# Altium footprint library sun_library.PcbLib: 412 footprints (part 13 of 26) (continued)
## LOGO_SUKHOVEY [mm] (continued)

## LogoMAR [mm]
Top:
  lines w0.15: -4.29,2.2 4.4,2.2 ; -4.289,2.4 4.4,2.4 ; -4.28,2.1 4.4,2.1 ; -4.278,2.5 4.4,2.5 ; -4.27,2 4.4,2 ; -4.267,2.6 4.4,2.6 ; -4.26,1.9 4.4,1.9 ; -4.255,2.7 -0.099,2.7 ; -4.25,1.8 2.1,1.8 ; -4.244,2.8 -0.199,2.8 -0.2,0 ; -4.24,1.7 -2.19,1.7 ; -4.233,2.9 -0.299,2.9 ; -4.23,1.6 -2.19,1.6 ; -4.222,3 -0.399,3 ; -4.22,1.5 -2.191,1.5 ; -4.211,3.1 -0.499,3.1 ; -4.21,1.4 -2.191,1.4 ; -4.2,1.302 -4.2,3.199 ; -4.183,3.3 -0.699,3.3 ; -4.175,1.2 -2.191,1.2 ; -4.167,3.4 -0.799,3.4 ; -4.15,1.1 -2.192,1.1 ; -4.15,3.5 -0.899,3.5 ; -4.133,3.6 -0.999,3.6 -1,0.701 ; -4.125,1 -2.192,1 ; -4.117,3.7 -1.099,3.7 ; -4.075,0.8 -2.192,0.8 ; -4.05,0.7 -2.192,0.7 ; -4.025,0.6 -2.193,0.6 ; -4,0.501 -4,3.891 ; -4,0.5 -2.193,0.5 ; -3.99,3.9 -1.299,3.9 ; -3.975,0.4 -2.193,0.4 ; -3.95,0.3 -2.193,0.3 ; -3.925,0.2 -2.194,0.2 ; -3.9,3.981 -3.9,0.101 ; -3.86,0 -2.194,0 ; -3.82,-0.1 -2.194,-0.1 ; -3.8,-0.149 -3.8,3.991 ; -3.78,-0.2 -2.194,-0.2 ; -3.74,-0.3 -2.195,-0.3 ; -3.7,-0.4 -2.195,-0.4 ; -3.7,-0.399 -3.7,3.991 ; -3.66,-0.5 -2.195,-0.5 ; -3.62,-0.6 -2.195,-0.6 ; -3.6,-0.649 -3.6,3.991 ; -3.58,-0.7 -2.196,-0.7 ; -3.54,-0.8 -2.196,-0.8 ; -3.5,-0.9 -2.196,-0.9 ; -3.5,3.991 -3.5,-0.899 ; -3.437,-1 -2.196,-1 ; -3.4,-1.059 -3.4,3.991 ; -3.375,-1.1 -2.196,-1.1 ; -3.312,-1.2 -2.197,-1.2 ; -3.3,-1.219 -3.3,3.991 ; -3.25,-1.3 -2.197,-1.3 ; -3.2,-1.379 -3.2,3.991 ; -3.187,-1.4 -2.197,-1.4 ; -3.125,-1.5 -2.197,-1.5 ; -3.1,-1.539 -3.1,3.991 ; -3.062,-1.6 -2.198,-1.6 ; -3,-1.7 -2.198,-1.7 ; -3,3.991 -3,-1.699 ; -2.925,-1.8 -2.198,-1.8 ; -2.9,-1.833 -2.9,3.991 ; -2.85,-1.9 -2.198,-1.9 ; -2.8,-1.966 -2.8,3.991 ; -2.775,-2 -2.199,-2 ; -2.699,-2.1 -2.199,-2.1 ; -2.7,3.991 -2.7,-2.099 ; -2.6,3.991 -2.6,-2.199 -2.199,-2.2 ; -2.5,3.991 -2.5,-2.299 -2.199,-2.3 ; -2.4,-2.399 -2.4,3.991 ; -2.399,-2.4 -2.199,-2.4 ; -2.299,-2.5 -2.2,-2.5 ; -2.3,-2.499 -2.3,3.991 ; -2.2,3.992 -2.2,-2.599 ; -2.194,0.1 -3.9,0.1 ; -2.192,0.9 -4.1,0.9 -4.1,3.8 ; -2.191,1.3 -4.2,1.3 ; -2.1,1.719 -2.1,3.993 ; -2.099,-2.6 2,-2.6 ; -2.1,-2.5 -0.333,-2.5 ; -2.1,-2.4 -0.433,-2.4 ; -2.1,-2.3 -0.533,-2.3 ; -2.1,-2.2 -0.633,-2.2 ; -2.1,-2.1 -0.733,-2.1 ; -2.1,-2 -0.833,-2 ; -2.1,-1.9 -0.933,-1.9 ; -2.1,-1.8 -1.033,-1.8 ; -2.1,-1.7 -1.133,-1.7 ; -2.1,-1.6 -1.233,-1.6 ; -2.1,-1.5 -1.333,-1.5 ; -2.1,-1.4 -1.433,-1.4 ; -2.1,-1.3 -1.533,-1.3 ; -2.1,-1.2 -1.633,-1.2 ; -2.1,-1.1 -1.733,-1.1 ; -2.1,-1 -1.833,-1 ; -2.1,-0.9 -1.933,-0.9 ; -2.076,1.7 1.989,1.7 ; -2.016,-2.7 2,-2.7 ; -2,-2.713 -2,-0.833 ; -2,1.639 -2,3.994 ; -1.951,1.6 1.877,1.6 ; -1.9,-2.793 -1.9,-0.933 ; -1.9,1.56 -1.9,3.995 ; -1.891,-2.8 2,-2.8 ; -1.825,1.5 1.766,1.5 ; -1.8,-2.873 -1.8,-1.033 ; -1.8,1.48 -1.8,3.996 ; -1.766,-2.9 1.933,-2.9 ; -1.7,-2.953 -1.7,-1.133 ; -1.7,1.4 -1.7,3.997 ; -1.699,1.4 1.655,1.4 ; -1.641,-3 1.833,-3 ; -1.6,-1.233 -1.6,-3.033 ; -1.6,1.301 -1.6,3.998 ; -1.599,1.3 1.544,1.3 ; -1.516,-3.1 1.733,-3.1 ; -1.5,-3.113 -1.5,-1.333 ; -1.5,3.999 -1.5,1.201 1.433,1.2 ; -1.4,-3.193 -1.4,-1.433 ; -1.399,1.1 1.322,1.1 ; -1.4,1.101 -1.4,4 ; -1.391,-3.2 1.6,-3.2 1.6,-1.133 ; -1.3,-3.273 -1.3,-1.533 ; -1.3,1.001 -1.3,3.901 ; -1.299,1 1.211,1 ; -1.266,-3.3 1.45,-3.3 ; -1.2,-3.353 -1.2,-1.633 ; -1.2,0.901 -1.2,3.801 ; -1.199,0.9 1.1,0.9 1.1,3.627 ; -1.199,3.8 -4.1,3.8 ; -1.141,-3.4 1.311,-3.4 ; -1.1,-1.733 -1.1,-3.433 ; -1.1,3.701 -1.1,0.801 0.989,0.8 ; -1,-1.833 -1,-3.499 1.178,-3.5 ; -0.9,-3.566 -0.9,-1.933 ; -0.9,0.613 -0.9,3.501 ; -0.885,0.6 0.766,0.6 ; -0.849,-3.6 1.044,-3.6 ; -0.8,-3.633 -0.8,-2.033 ; -0.8,0.525 -0.8,3.401 ; -0.771,0.5 0.655,0.5 ; -0.7,-2.133 -0.7,-3.699 0.889,-3.7 ; -0.7,0.438 -0.7,3.301 ; -0.657,0.4 0.544,0.4 ; -0.6,-3.766 -0.6,-2.233 ; -0.6,0.35 -0.6,3.201 -4.2,3.2 ; -0.549,-3.8 0.722,-3.8 ; -0.542,0.3 0.433,0.3 ; -0.5,-3.833 -0.5,-2.333 ; -0.5,0.263 -0.5,3.101 ; -0.428,0.2 0.322,0.2 ; -0.4,-3.866 -0.4,-2.433 ; -0.4,0.175 -0.4,3.001 ; -0.314,0.1 0.211,0.1 ; -0.3,-3.9 -0.3,-2.533 ; -0.3,0.088 -0.3,2.901 ; -0.299,-3.9 0.555,-3.9 ; -0.2,-3.933 -0.2,-2.533 ; -0.1,-3.966 -0.1,-2.533 ; -0.1,0 -0.1,2.701 ; 0,-4 0,-2.533 ; 0,0 0,2.601 ; 0.001,-4 0.232,-4 ; 0.1,-2.533 0.1,-4.033 ; 0.1,2.694 0.1,0 ; 0.107,2.7 4.4,2.7 ; 0.2,-4.008 0.2,-2.533 ; 0.2,0.09 0.2,2.787 ; 0.214,2.8 4.382,2.8 ; 0.233,-2.5 2,-2.5 ; 0.3,-3.983 0.3,-2.433 ; 0.3,0.18 0.3,2.88 ; 0.321,2.9 4.364,2.9 ; 0.333,-2.4 2,-2.4 ; 0.4,-3.958 0.4,-2.333 ; 0.4,0.27 0.4,2.974 ; 0.428,3 4.346,3 ; 0.433,-2.3 2,-2.3 ; 0.5,-2.233 0.5,-3.933 ; 0.5,0.36 0.5,3.067 ; 0.533,-2.2 2,-2.2 ; 0.535,3.1 4.327,3.1 ; 0.6,-3.873 0.6,-2.133 ; 0.6,0.45 0.6,3.16 ; 0.633,-2.1 2,-2.1 ; 0.643,3.2 4.309,3.2 ; 0.7,-3.813 0.7,-2.033 ; 0.7,0.54 0.7,3.254 ; 0.733,-2 2,-2 ; 0.75,3.3 4.291,3.3 ; 0.8,-3.753 0.8,-1.933 ; 0.8,0.63 0.8,3.347 ; 0.833,-1.9 2,-1.9 ; 0.857,3.4 4.273,3.4 ; 0.877,0.7 -0.999,0.7 ; 0.9,-3.693 0.9,-1.833 ; 0.9,0.72 0.9,3.44 ; 0.933,-1.8 2,-1.8 ; 0.964,3.5 4.255,3.5 ; 1,-3.633 1,-1.733 ; 1,0.81 1,3.534 ; 1.033,-1.7 2,-1.7 ; 1.071,3.6 4.237,3.6 ; 1.1,-3.558 1.1,-1.633 ; 1.133,-1.6 2,-1.6 ; 1.178,3.7 4.218,3.7 ; 1.2,-3.483 1.2,-1.533 ; 1.2,0.99 1.2,3.72 ; 1.233,-1.5 2,-1.5 ; 1.285,3.8 4.2,3.8 ; 1.3,-3.408 1.3,-1.433 ; 1.3,1.08 1.3,3.814 ; 1.333,-1.4 2,-1.4 ; 1.393,3.9 4.101,3.9 ; 1.4,-3.333 1.4,-1.333 ; 1.4,1.17 1.4,3.907 ; 1.433,-1.3 2,-1.3 ; 1.5,-3.267 1.5,-1.233 ; 1.5,1.26 1.5,4 ; 1.533,-1.2 2,-1.2 ; 1.6,1.35 1.6,4 ; 1.633,-1.1 2,-1.1 ; 1.7,-1.033 1.7,-3.133 ; 1.7,1.44 1.7,4 ; 1.733,-1 2,-1 ; 1.8,-3.033 1.8,-0.933 ; 1.8,1.53 1.8,4 ; 1.833,-0.9 2,-0.9 ; 1.9,-2.933 1.9,-0.833 ; 1.9,1.62 1.9,4 ; 2,1.71 2,4 ; 2.1,-2.7 2.2,-2.7 2.2,4 ; 2.1,-2.6 2.3,-2.6 2.3,4 ; 2.1,-2.5 2.4,-2.5 ; 2.1,-2.4 2.5,-2.4 2.5,4 ; 2.1,-2.3 2.6,-2.3 2.6,4 ; 2.1,-2.2 2.7,-2.2 2.7,4 ; 2.1,-2.1 2.8,-2.1 ; 2.1,-2 2.871,-2 ; 2.1,-1.9 2.943,-1.9 ; 2.1,-1.8 3.014,-1.8 ; 2.1,-1.7 3.086,-1.7 ; 2.1,-1.6 3.157,-1.6 ; 2.1,-1.5 3.228,-1.5 ; 2.1,-1.4 3.3,-1.4 3.3,4 ; 2.1,-1.3 3.357,-1.3 ; 2.1,-1.2 3.414,-1.2 ; 2.1,-1.1 3.471,-1.1 ; 2.1,-1 3.528,-1 ; 2.1,-0.9 3.586,-0.9 ; 2.1,-0.8 3.643,-0.8 ; 2.1,-0.7 3.7,-0.7 ; 2.1,-0.6 3.74,-0.6 ; 2.1,-0.5 3.78,-0.5 ; 2.1,-0.4 3.82,-0.4 ; 2.1,-0.3 3.86,-0.3 ; 2.1,-0.2 3.9,-0.2 3.9,4 ; 2.1,-0.1 3.94,-0.1 ; 2.1,0 3.98,0 ; 2.1,0.1 4.02,0.1 ; 2.1,0.2 4.06,0.2 ; 2.1,0.3 4.1,0.3 4.1,3.901 ; 2.1,0.4 4.122,0.4 ; 2.1,0.5 4.144,0.5 ; 2.1,0.6 4.167,0.6 ; 2.1,0.7 4.189,0.7 ; 2.1,0.8 4.211,0.8 ; 2.1,0.9 4.233,0.9 ; 2.1,1 4.256,1 ; 2.1,1.1 4.278,1.1 ; 2.1,1.2 4.3,1.2 ; 2.1,1.3 4.314,1.3 ; 2.1,1.4 4.329,1.4 ; 2.1,1.5 4.343,1.5 ; 2.1,1.6 4.357,1.6 ; 2.1,1.7 4.372,1.7 ; 2.1,1.8 4.386,1.8 ; 2.1,4 2.1,1.8 ; 2.4,-2.5 2.4,4 ; 2.8,4 2.8,-2.1 ; 2.9,-1.96 2.9,4 ; 3,-1.82 3,4 ; 3.1,-1.68 3.1,4 ; 3.2,-1.54 3.2,4 ; 3.4,-1.225 3.4,4 ; 3.5,-1.05 3.5,4 ; 3.6,-0.875 3.6,4 ; 3.7,4 3.7,-0.7 ; 3.8,-0.45 3.8,4 ; 4,0.05 4,4 ; 4.2,0.75 4.2,3.801 ; 4.3,3.251 4.3,1.2 ; 4.4,2.3 -4.3,2.3 ; 4.4,2.701 4.4,1.899 ; -4.3,2.3 -4.2,1.3 ; -4.3,2.3 -4.2,3.2 ; -4.2,1.3 -3.9,0.1 ; -4.2,3.2 -4.1,3.8 ; -4.1,3.8 -3.89,3.991 -2.3,3.991 ; -3.9,0.1 -3.5,-0.9 ; -3.5,-0.9 -3,-1.7 ; -3,-1.7 -2.7,-2.1 ; -2.7,-2.1 -2.2,-2.6 ; -2.3,3.991 -1.4,4 ; -2.2,-2.6 -2.19,1.79 -1.7,1.4 -1,0.7 ; -1.6,-3.033 -2.099,-2.633 -2.1,-0.733 -0.3,-2.533 ; -1.6,-3.033 -1.1,-3.433 ; -1.4,4 0,2.6 ; -1.1,-3.433 -0.5,-3.833 0.1,-4.033 ; -1,0.7 -0.2,0 ; -0.3,-2.533 0.2,-2.533 2,-0.733 ; -0.2,0 0.1,0 ; 0,2.6 1.5,4 ; 0.1,-4.033 0.5,-3.933 ; 0.1,0 2.1,1.8 ; 0.5,-3.933 1,-3.633 1.4,-3.333 1.7,-3.133 ; 1.5,4 4.001,4 ; 1.5,4 4,4 ; 1.7,-3.133 2,-2.833 ; 2,-2.833 2,-0.733 ; 2,-2.833 2,-0.733 ; 2.1,1.8 2.1,-2.8 2.8,-2.1 ; 2.8,-2.1 3.3,-1.4 3.7,-0.7 ; 3.7,-0.7 4.1,0.3 4.3,1.2 ; 4,4 4.2,3.8 ; 4.2,3.8 4.4,2.7 ; 4.3,1.2 4.4,1.9 ; 4.4,1.9 4.4,2.7
Top Overlay:
  drawing of 265 lines, arcs and shapes, not listed
Top Solder:
  drawing of 259 lines, arcs and shapes, not listed

## LQFP48 [mm] "Thin QFP, 48-Leads, Body 7x7mm, Pitch 0.5mm, IPC Medium Density"
height 1.6
pads (48):
  oval 1.45x0.25 smd mask+0.075: 1(-4.225,2.75) 2(-4.225,2.25) 3(-4.225,1.75) 4(-4.225,1.25) 5(-4.225,0.75) 6(-4.225,0.25) 7(-4.225,-0.25) 8(-4.225,-0.75) 9(-4.225,-1.25) 10(-4.225,-1.75) 11(-4.225,-2.25) 12(-4.225,-2.75) 25(4.225,-2.75) 26(4.225,-2.25) 27(4.225,-1.75) 28(4.225,-1.25) 29(4.225,-0.75) 30(4.225,-0.25) 31(4.225,0.25) 32(4.225,0.75) 33(4.225,1.25) 34(4.225,1.75) 35(4.225,2.25) 36(4.225,2.75)
  oval 0.25x1.45 smd mask+0.075: 13(-2.75,-4.225) 14(-2.25,-4.225) 15(-1.75,-4.225) 16(-1.25,-4.225) 17(-0.75,-4.225) 18(-0.25,-4.225) 19(0.25,-4.225) 20(0.75,-4.225) 21(1.25,-4.225) 22(1.75,-4.225) 23(2.25,-4.225) 24(2.75,-4.225) 37(2.75,4.225) 38(2.25,4.225) 39(1.75,4.225) 40(1.25,4.225) 41(0.75,4.225) 42(0.25,4.225) 43(-0.25,4.225) 44(-0.75,4.225) 45(-1.25,4.225) 46(-1.75,4.225) 47(-2.25,4.225) 48(-2.75,4.225)
Top Overlay:
  circle w0.25: c-4.075,3.55 r0.125
  circle w0.5: c-2.275,2.325 r0.25
  lines w0.15: -3.05,-3.05 -3.05,3.05 3.075,3.05 3.075,-3.05 -3.05,-3.05
TopAssy 13:
  circle w0.15: c-2.6,2.6 r0.5
  lines w0.15: -3.5,-2.825 -4.35,-2.825 -4.35,-2.675 -3.5,-2.675 ; -3.5,-2.325 -4.35,-2.325 -4.35,-2.175 -3.5,-2.175 ; -3.5,-1.825 -4.35,-1.825 -4.35,-1.675 -3.5,-1.675 ; -3.5,-1.325 -4.35,-1.325 -4.35,-1.175 -3.5,-1.175 ; -3.5,-0.825 -4.35,-0.825 -4.35,-0.675 -3.5,-0.675 ; -3.5,-0.325 -4.35,-0.325 -4.35,-0.175 -3.5,-0.175 ; -3.5,0.175 -4.35,0.175 -4.35,0.3 -3.5,0.3 ; -3.5,0.675 -4.35,0.675 -4.35,0.825 -3.5,0.825 ; -3.5,1.175 -4.35,1.175 -4.35,1.325 -3.5,1.325 ; -3.5,1.675 -4.35,1.675 -4.35,1.825 -3.5,1.825 ; -3.5,2.175 -4.35,2.175 -4.35,2.325 -3.5,2.325 ; -3.5,2.675 -4.35,2.675 -4.35,2.825 -3.5,2.825 ; -2.825,-3.5 -2.825,-4.35 -2.675,-4.35 -2.675,-3.5 ; -2.825,3.5 -2.825,4.35 -2.675,4.35 -2.675,3.5 ; -2.325,-3.5 -2.325,-4.35 -2.175,-4.35 -2.175,-3.5 ; -2.325,3.5 -2.325,4.35 -2.175,4.35 -2.175,3.5 ; -1.825,-3.5 -1.825,-4.35 -1.675,-4.35 -1.675,-3.5 ; -1.825,3.5 -1.825,4.35 -1.675,4.35 -1.675,3.5 ; -1.325,-3.5 -1.325,-4.35 -1.175,-4.35 -1.175,-3.5 ; -1.325,3.5 -1.325,4.35 -1.175,4.35 -1.175,3.5 ; -0.825,-3.5 -0.825,-4.35 -0.675,-4.35 -0.675,-3.5 ; -0.825,3.5 -0.825,4.35 -0.675,4.35 -0.675,3.5 ; -0.325,3.5 -0.325,4.35 -0.175,4.35 -0.175,3.5 ; -0.3,-3.5 -0.3,-4.35 -0.175,-4.35 -0.175,-3.5 ; 0.175,-3.5 0.175,-4.35 0.325,-4.35 0.325,-3.5 ; 0.175,3.5 0.175,4.35 0.3,4.35 0.3,3.5 ; 0.675,-3.5 0.675,-4.35 0.825,-4.35 0.825,-3.5 ; 0.675,3.5 0.675,4.35 0.825,4.35 0.825,3.5 ; 1.175,-3.5 1.175,-4.35 1.325,-4.35 1.325,-3.5 ; 1.175,3.5 1.175,4.35 1.325,4.35 1.325,3.5 ; 1.675,-3.5 1.675,-4.35 1.825,-4.35 1.825,-3.5 ; 1.675,3.5 1.675,4.35 1.825,4.35 1.825,3.5 ; 2.175,-3.5 2.175,-4.35 2.325,-4.35 2.325,-3.5 ; 2.175,3.5 2.175,4.35 2.325,4.35 2.325,3.5 ; 2.675,-3.5 2.675,-4.35 2.825,-4.35 2.825,-3.5 ; 2.675,3.5 2.675,4.35 2.825,4.35 2.825,3.5 ; 3.5,-2.825 4.35,-2.825 4.35,-2.675 3.5,-2.675 ; 3.5,-2.325 4.35,-2.325 4.35,-2.175 3.5,-2.175 ; 3.5,-1.825 4.35,-1.825 4.35,-1.675 3.5,-1.675 ; 3.5,-1.325 4.35,-1.325 4.35,-1.175 3.5,-1.175 ; 3.5,-0.825 4.35,-0.825 4.35,-0.675 3.5,-0.675 ; 3.5,-0.3 4.35,-0.3 4.35,-0.175 3.5,-0.175 ; 3.5,0.175 4.35,0.175 4.35,0.325 3.5,0.325 ; 3.5,0.675 4.35,0.675 4.35,0.825 3.5,0.825 ; 3.5,1.175 4.35,1.175 4.35,1.325 3.5,1.325 ; 3.5,1.675 4.35,1.675 4.35,1.825 3.5,1.825 ; 3.5,2.175 4.35,2.175 4.35,2.325 3.5,2.325 ; 3.5,2.675 4.35,2.675 4.35,2.825 3.5,2.825 ; -3.5,-3.5 -3.5,3.5 3.5,3.5 3.5,-3.5 -3.5,-3.5
CourtTop 15:
  lines w0.05: -0.5,0 0.5,0 ; 0,-0.5 0,0.5 ; -5.2,-5.2 -5.2,5.2 5.2,5.2 5.2,-5.2 -5.2,-5.2
3D body "User Library-LQFP48-0_5.step": height 1.56, standoff -0.01, extent -4.386,-4.4 4.386,4.372

## LQFP64_N [mm] "Thin QFP, 64-Leads, Body 10x10mm, Pitch 0.5mm, IPC Medium Density"
height 1.6
pads (64):
  oval 1.2x0.249 smd mask+0.075: 1(-5.75,3.75) 2(-5.75,3.25) 3(-5.75,2.75) 4(-5.75,2.25) 5(-5.75,1.75) 6(-5.75,1.25) 7(-5.75,0.75) 8(-5.75,0.25) 9(-5.75,-0.25) 10(-5.75,-0.75) 11(-5.75,-1.25) 12(-5.75,-1.75) 13(-5.75,-2.25) 14(-5.75,-2.75) 15(-5.75,-3.25) 16(-5.75,-3.75) 33(5.75,-3.75) 34(5.75,-3.25) 35(5.75,-2.75) 36(5.75,-2.25) 37(5.75,-1.75) 38(5.75,-1.25) 39(5.75,-0.75) 40(5.75,-0.25) 41(5.75,0.25) 42(5.75,0.75) 43(5.75,1.25) 44(5.75,1.75) 45(5.75,2.25) 46(5.75,2.75) 47(5.75,3.25) 48(5.75,3.75)
  oval 0.249x1.2 smd mask+0.075: 17(-3.75,-5.75) 18(-3.25,-5.75) 19(-2.75,-5.75) 20(-2.25,-5.75) 21(-1.75,-5.75) 22(-1.25,-5.75) 23(-0.75,-5.75) 24(-0.25,-5.75) 25(0.25,-5.75) 26(0.75,-5.75) 27(1.25,-5.75) 28(1.75,-5.75) 29(2.25,-5.75) 30(2.75,-5.75) 31(3.25,-5.75) 32(3.75,-5.75) 49(3.75,5.75) 50(3.25,5.75) 51(2.75,5.75) 52(2.25,5.75) 53(1.75,5.75) 54(1.25,5.75) 55(0.75,5.75) 56(0.25,5.75) 57(-0.25,5.75) 58(-0.75,5.75) 59(-1.25,5.75) 60(-1.75,5.75) 61(-2.25,5.75) 62(-2.75,5.75) 63(-3.25,5.75) 64(-3.75,5.75)
Top Overlay:
  circle w0.15: c-6.25,4.425 r0.125
  circle w0.15: c-3.25,3.25 r0.3
  lines w0.15: -4.25,-4.25 -4.25,4.25 4.25,4.25 4.25,-4.25 -4.25,-4.25
TopAssy 13:
  circle w0.15: c-4.1,4.1 r0.5
  lines w0.15: -6,-3.75 -5,-3.75 ; -6,-3.25 -5,-3.25 ; -6,-2.75 -5,-2.75 ; -6,-2.25 -5,-2.25 ; -6,-1.75 -5,-1.75 ; -6,-1.25 -5,-1.25 ; -6,-0.75 -5,-0.75 ; -6,-0.25 -5,-0.25 ; -6,0.25 -5,0.25 ; -6,0.75 -5,0.75 ; -6,1.25 -5,1.25 ; -6,1.75 -5,1.75 ; -6,2.25 -5,2.25 ; -6,2.75 -5,2.75 ; -6,3.25 -5,3.25 ; -6,3.75 -5,3.75 ; -3.75,-6 -3.75,-5 ; -3.75,5 -3.75,6 ; -3.25,-6 -3.25,-5 ; -3.25,5 -3.25,6 ; -2.75,-6 -2.75,-5 ; -2.75,5 -2.75,6 ; -2.25,-6 -2.25,-5 ; -2.25,5 -2.25,6 ; -1.75,-6 -1.75,-5 ; -1.75,5 -1.75,6 ; -1.25,-6 -1.25,-5 ; -1.25,5 -1.25,6 ; -0.75,-6 -0.75,-5 ; -0.75,5 -0.75,6 ; -0.25,-6 -0.25,-5 ; -0.25,5 -0.25,6 ; 0.25,-6 0.25,-5 ; 0.25,5 0.25,6 ; 0.75,-6 0.75,-5 ; 0.75,5 0.75,6 ; 1.25,-6 1.25,-5 ; 1.25,5 1.25,6 ; 1.75,-6 1.75,-5 ; 1.75,5 1.75,6 ; 2.25,-6 2.25,-5 ; 2.25,5 2.25,6 ; 2.75,-6 2.75,-5 ; 2.75,5 2.75,6 ; 3.25,-6 3.25,-5 ; 3.25,5 3.25,6 ; 3.75,-6 3.75,-5 ; 3.75,5 3.75,6 ; 5,-3.75 6,-3.75 ; 5,-3.25 6,-3.25 ; 5,-2.75 6,-2.75 ; 5,-2.25 6,-2.25 ; 5,-1.75 6,-1.75 ; 5,-1.25 6,-1.25 ; 5,-0.75 6,-0.75 ; 5,-0.25 6,-0.25 ; 5,0.25 6,0.25 ; 5,0.75 6,0.75 ; 5,1.25 6,1.25 ; 5,1.75 6,1.75 ; 5,2.25 6,2.25 ; 5,2.75 6,2.75 ; 5,3.25 6,3.25 ; 5,3.75 6,3.75 ; -5,-5 -5,5 5,5 5,-5 -5,-5
CourtTop 15:
  lines w0.05: -0.5,0 0.5,0 ; 0,-0.5 0,0.5 ; -6.7,-6.7 -6.7,6.7 6.7,6.7 6.7,-6.7 -6.7,-6.7
3D body "QFP50P1200X1200X120-64N.step": height 1.35, standoff 0, extent -6,-6.028 6.028,6

## LQFP64_N_PAD [mm] "Thin QFP, 64-Leads, Body 10x10mm, Pitch 0.5mm, PAD 5x5, IPC Medium Density"
height 1.6
pads (65):
  oval 1.4x0.25 smd mask+0.075: 1(-5.75,3.75) 2(-5.75,3.25) 3(-5.75,2.75) 4(-5.75,2.25) 5(-5.75,1.75) 6(-5.75,1.25) 7(-5.75,0.75) 8(-5.75,0.25) 9(-5.75,-0.25) 10(-5.75,-0.75) 11(-5.75,-1.25) 12(-5.75,-1.75) 13(-5.75,-2.25) 14(-5.75,-2.75) 15(-5.75,-3.25) 16(-5.75,-3.75)
  oval 0.25x1.4 smd mask+0.075: 17(-3.75,-5.75) 18(-3.25,-5.75) 19(-2.75,-5.75) 20(-2.25,-5.75) 21(-1.75,-5.75) 22(-1.25,-5.75) 23(-0.75,-5.75) 24(-0.25,-5.75) 25(0.25,-5.75) 26(0.75,-5.75) 27(1.25,-5.75) 28(1.75,-5.75) 29(2.25,-5.75) 30(2.75,-5.75) 31(3.25,-5.75) 32(3.75,-5.75) 49(3.75,5.75) 50(3.25,5.75) 51(2.75,5.75) 52(2.25,5.75) 53(1.75,5.75) 54(1.25,5.75) 55(0.75,5.75) 56(0.25,5.75) 57(-0.25,5.75) 58(-0.75,5.75) 59(-1.25,5.75) 60(-1.75,5.75) 61(-2.25,5.75) 62(-2.75,5.75) 63(-3.25,5.75) 64(-3.75,5.75)
  oval 1.5x0.25 smd mask+0.075: 33(5.75,-3.75) 34(5.75,-3.25) 35(5.75,-2.75) 36(5.75,-2.25) 37(5.75,-1.75) 38(5.75,-1.25) 39(5.75,-0.75) 40(5.75,-0.25) 41(5.75,0.25) 42(5.75,0.75) 43(5.75,1.25) 44(5.75,1.75) 45(5.75,2.25) 46(5.75,2.75) 47(5.75,3.25) 48(5.75,3.75)
  rect 5x5 smd mask+0.075: 65(0,0)
Top Overlay:
  circle w0.15: c-6.25,4.425 r0.125
  circle w0.15: c-3.25,3.25 r0.3
  lines w0.15: -4.25,-4.25 -4.25,4.25 4.25,4.25 4.25,-4.25 -4.25,-4.25
TopAssy 13:
  circle w0.15: c-4.1,4.1 r0.5
  lines w0.15: -5.95,-3.75 -5,-3.75 ; -5.95,-3.25 -5,-3.25 ; -5.95,-2.75 -5,-2.75 ; -5.95,-2.25 -5,-2.25 ; -5.95,-1.75 -5,-1.75 ; -5.95,-1.25 -5,-1.25 ; -5.95,-0.75 -5,-0.75 ; -5.95,-0.25 -5,-0.25 ; -5.95,0.25 -5,0.25 ; -5.95,0.75 -5,0.75 ; -5.95,1.25 -5,1.25 ; -5.95,1.75 -5,1.75 ; -5.95,2.25 -5,2.25 ; -5.95,2.75 -5,2.75 ; -5.95,3.25 -5,3.25 ; -5.95,3.75 -5,3.75 ; -3.75,-5.95 -3.75,-5 ; -3.75,5 -3.75,5.95 ; -3.25,-5.95 -3.25,-5 ; -3.25,5 -3.25,5.95 ; -2.75,-5.95 -2.75,-5 ; -2.75,5 -2.75,5.95 ; -2.25,-5.95 -2.25,-5 ; -2.25,5 -2.25,5.95 ; -1.75,-5.95 -1.75,-5 ; -1.75,5 -1.75,5.95 ; -1.25,-5.95 -1.25,-5 ; -1.25,5 -1.25,5.95 ; -0.75,-5.95 -0.75,-5 ; -0.75,5 -0.75,5.95 ; -0.25,-5.95 -0.25,-5 ; -0.25,5 -0.25,5.95 ; 0.25,-5.95 0.25,-5 ; 0.25,5 0.25,5.95 ; 0.75,-5.95 0.75,-5 ; 0.75,5 0.75,5.95 ; 1.25,-5.95 1.25,-5 ; 1.25,5 1.25,5.95 ; 1.75,-5.95 1.75,-5 ; 1.75,5 1.75,5.95 ; 2.25,-5.95 2.25,-5 ; 2.25,5 2.25,5.95 ; 2.75,-5.95 2.75,-5 ; 2.75,5 2.75,5.95 ; 3.25,-5.95 3.25,-5 ; 3.25,5 3.25,5.95 ; 3.75,-5.95 3.75,-5 ; 3.75,5 3.75,5.95 ; 5,-3.75 5.95,-3.75 ; 5,-3.25 5.95,-3.25 ; 5,-2.75 5.95,-2.75 ; 5,-2.25 5.95,-2.25 ; 5,-1.75 5.95,-1.75 ; 5,-1.25 5.95,-1.25 ; 5,-0.75 5.95,-0.75 ; 5,-0.25 5.95,-0.25 ; 5,0.25 5.95,0.25 ; 5,0.75 5.95,0.75 ; 5,1.25 5.95,1.25 ; 5,1.75 5.95,1.75 ; 5,2.25 5.95,2.25 ; 5,2.75 5.95,2.75 ; 5,3.25 5.95,3.25 ; 5,3.75 5.95,3.75 ; -5,-5 -5,5 5,5 5,-5 -5,-5
CourtTop 15:
  lines w0.05: -0.5,0 0.5,0 ; 0,-0.5 0,0.5 ; -6.7,-6.7 -6.7,6.7 6.7,6.7 6.7,-6.7 -6.7,-6.7
3D body "QFP50P1200X1200X120-64N.step": height 1.35, standoff 0, extent -6,-6.028 6.028,6

## Lxx Series GPS [mm]
height 3.2
pads (28):
  oval 2.5x0.8 smd: 1(-8.5,8.5) 2(-8.5,7.4) 3(-8.5,6.3) 4(-8.5,5.2) 5(-8.5,4.1) 6(-8.5,3) 7(-8.5,1.9) 8(-8.5,0.8) 9(-8.5,-3) 10(-8.5,-4.1) 11(-8.5,-5.2) 12(-8.5,-6.3) 13(-8.5,-7.4) 14(-8.5,-8.5) 15(8.5,-8.5) 16(8.5,-7.4) 17(8.5,-6.3) 18(8.5,-5.2) 19(8.5,-4.1) 20(8.5,-3) 21(8.5,0.8) 22(8.5,1.9) 23(8.5,3) 24(8.5,4.1) 25(8.5,5.2) 26(8.5,6.3) 27(8.5,7.4) 28(8.5,8.5)
Top Overlay:
  circle w0.15: c-7.727,10.5 r0.127
  lines w0.15: -8.5,-9.5 -8.5,-11.4 8.5,-11.4 8.5,-9.5 ; -8.5,-2 -8.5,0 ; -8.5,9.5 -8.5,10.5 ; -8.45,10.55 -7.7,11.3 8.5,11.3 8.5,9.3 ; 8.5,-2 8.5,0
3D body "QUECTEL L10 GPS.step": height 3.17, standoff 0, extent -8.5,-11.4 8.5,11

## M2_NUT 1.5MM [mm] "M2_NUT  WURTH"
height 1.5
TopAssy 13:
  circle w0.15: c0,0 r1.6
  lines w0.15: -3.529,0 3.529,0 ; 0,-3.529 0,3.529
3D body "User Library-STEP-9774015243R-rev1.step": height 1.51, standoff -1.39, extent -2.175,-2.175 2.175,2.175